# Altium integrated library TerminalBlocksRisingCage_5.00mm.IntLib: 64 symbols
Pins are listed as number, name and electrical type; pins without a type are passive.

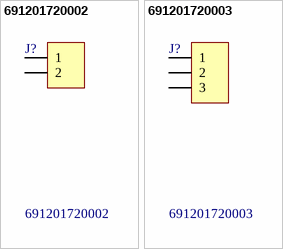
[diagram p0: symbols 691201720002 to 691201720003]

## 691201720002
designator J?
WR-TBL 45° Entry Modular with Rising Cage Clamp,Serie 201 - 5.00 mm; Manufacturer: Würth Elektronik eiSos GmbH; ComponentLink1 Description: Manufacturer; ComponentLink2 Description: Datasheet; NoPins: 2; Created Date: 21 Novenber 2013; partNo: 691201720002; ComponentLink1URL: http://www.we-online.com; ComponentLink2URL: http://katalog.we-online.de/em/datasheet/6912017200xx.pdf; Created by: Karrer Zheng
footprint 691201720002 (5,00mm - modular - blue -45° entry with rising cage clamp - 02p)
pins: 1, 2

## 691201720003
designator J?
WR-TBL 45° Entry Modular with Rising Cage Clamp,Serie 201 - 5.00 mm; Manufacturer: Würth Elektronik eiSos GmbH; ComponentLink1 Description: Manufacturer; ComponentLink2 Description: Datasheet; NoPins: 3; Created Date: 21 Novenber 2013; partNo: 691201720003; ComponentLink1URL: http://www.we-online.com; ComponentLink2URL: http://katalog.we-online.de/em/datasheet/6912017200xx.pdf; Created by: Karrer Zheng
footprint 691201720003 (5,00mm - modular - blue -45° entry with rising cage clamp - 03p)
pins: 1, 2, 3


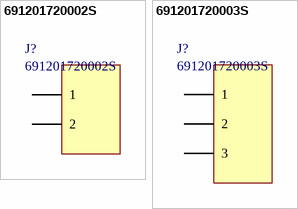
[diagram p1: symbols 691201720002S to 691201720003S]

## 691201720002S
designator J?
45° Cable Entry with Rising Cage Clamp, Serie 201S - 5.00 mm; Manufacturer: Wurth Elektronik; ComponentLink1 Description: Manufacturer; ComponentLink2 Description: Datasheet; NoPins: 2; ComponentLink1 URL: http://www.we-online.com; ComponentLink2 URL: http://katalog.we-online.de/em/datasheet/6912017200xxS.pdf; Created By: Baojun Chen; Created Date: 6-Aug-15; PartNo: 691201720002S
footprint 691201720002S (Serie 201S - 5.00 mm _ 2 pins)
pins: 1, 2

## 691201720003S
designator J?
45° Cable Entry with Rising Cage Clamp, Serie 201S - 5.00 mm; Manufacturer: Wurth Elektronik; ComponentLink1 Description: Manufacturer; ComponentLink2 Description: Datasheet; NoPins: 3; ComponentLink1 URL: http://www.we-online.com; ComponentLink2 URL: http://katalog.we-online.de/em/datasheet/6912017200xxS.pdf; Created By: Baojun Chen; Created Date: 6-Aug-15; PartNo: 691201720003S
footprint 691201720003S (Serie 201S - 5.00 mm _ 3 pins)
pins: 1, 2, 3


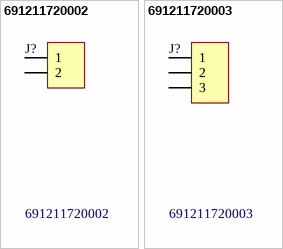
[diagram p2: symbols 691211720002 to 691211720003]

## 691211720002
designator J?
WR-TBL 45° Entry Modular with Rising Cage Clamp,Serie 211 - 5.00 mm - 15.5 mm Height; Manufacturer: Würth Elektronik eiSos GmbH; ComponentLink1 Description: Manufacturer; ComponentLink2 Description: Datasheet; NoPins: 2; Created Date: 25 Novenber 2013; partNo: 691211720002; ComponentLink1URL: http://www.we-online.com; ComponentLink2URL: http://katalog.we-online.de/em/datasheet/6912117200xx.pdf; Created by: Karrer Zheng
footprint 691211720002 (5,00mm - modular - green -45° entry with rising cage clamp - 02p)
pins: 1, 2

## 691211720003
designator J?
WR-TBL 45° Entry Modular with Rising Cage Clamp,Serie 211 - 5.00 mm - 15.5 mm Height; Manufacturer: Würth Elektronik eiSos GmbH; ComponentLink1 Description: Manufacturer; ComponentLink2 Description: Datasheet; NoPins: 3; Created Date: 25 Novenber 2013; partNo: 691211720003; ComponentLink1URL: http://www.we-online.com; ComponentLink2URL: http://katalog.we-online.de/em/datasheet/6912117200xx.pdf; Created by: Karrer Zheng
footprint 691211720003 (5,00mm - modular - green -45° entry with rising cage clamp - 03p)
pins: 1, 2, 3


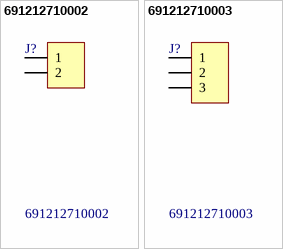
[diagram p3: symbols 691212710002 to 691212710003]

## 691212710002
designator J?
WR-TBL Horizontal Entry Modular with Rising Cage Clamp,Serie 212 - 5.00 mm; Manufacturer: Würth Elektronik eiSos GmbH; ComponentLink1 Description: Manufacturer; ComponentLink2 Description: Datasheet; NoPins: 2; Created Date: 25 Novenber 2013; partNo: 691212710002; ComponentLink1URL: http://www.we-online.com; ComponentLink2URL: http://katalog.we-online.de/em/datasheet/6912127200xx.pdf; Created by: Karrer Zheng
footprint 691212710002 (5,00mm - modular - green - Horizontal entry with rising cage clamp -  14,3mm height - 02p)
pins: 1, 2

## 691212710003
designator J?
WR-TBL Horizontal Entry Modular with Rising Cage Clamp,Serie 212 - 5.00 mm; Manufacturer: Würth Elektronik eiSos GmbH; ComponentLink1 Description: Manufacturer; ComponentLink2 Description: Datasheet; NoPins: 3; Created Date: 25 Novenber 2013; partNo: 691212710003; ComponentLink1URL: http://www.we-online.com; ComponentLink2URL: http://katalog.we-online.de/em/datasheet/6912127200xx.pdf; Created by: Karrer Zheng
footprint 691212710003 (5,00mm - modular - green - Horizontal entry with rising cage clamp -  14,3mm height - 03p)
pins: 1, 2, 3


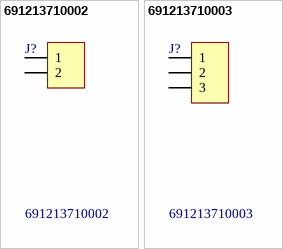
[diagram p4: symbols 691213710002 to 691213710003]

## 691213710002
designator J?
WR-TBL Horizontal Entry Modular with Rising Cage Clamp,Serie 213 - 5.00 mm; Manufacturer: Würth Elektronik eiSos GmbH; ComponentLink1 Description: Manufacturer; ComponentLink2 Description: Datasheet; NoPins: 2; Created Date: 25 Novenber 2013; partNo: 691213710002; ComponentLink1URL: http://www.we-online.com; ComponentLink2URL: http://katalog.we-online.de/em/datasheet/6912137100xx.pdf; Created by: Karrer Zheng
footprint 691213710002 (5,00mm - modular - green - Horizontal entry with rising cage clamp -  10,0mm height - 02p)
pins: 1, 2

## 691213710003
designator J?
WR-TBL Horizontal Entry Modular with Rising Cage Clamp,Serie 213 - 5.00 mm; Manufacturer: Würth Elektronik eiSos GmbH; ComponentLink1 Description: Manufacturer; ComponentLink2 Description: Datasheet; NoPins: 3; Created Date: 25 Novenber 2013; partNo: 691213710003; ComponentLink1URL: http://www.we-online.com; ComponentLink2URL: http://katalog.we-online.de/em/datasheet/6912137100xx.pdf; Created by: Karrer Zheng
footprint 691213710003 (5,00mm - modular - green - Horizontal entry with rising cage clamp -  10,0mm height - 03p)
pins: 1, 2, 3


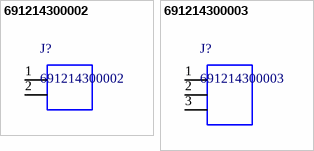
[diagram p5: symbols 691214300002 to 691214300003]

## 691214300002
designator J?
WR-TBL Vertical Cable Entry With Rising Cage Clamp,Serie 2143 - 3.81 mm; Manufacturer: Wurth Elektronik; ComponentLink1 Description: Manufacturer; ComponentLink2 Description: Datasheet; ComponentLink1URL: http://www.we-online.de; Created by: Baojun Chen; Created Date: 8.Sep.2015; partNo: 691214300002
footprint 691214300002 (Serie 2143 - 3.81 mm _ 2 pins)
pins: 1, 2

## 691214300003
designator J?
WR-TBL Vertical Cable Entry With Rising Cage Clamp,Serie 2143 - 3.81 mm; Manufacturer: Wurth Elektronik; ComponentLink1 Description: Manufacturer; ComponentLink2 Description: Datasheet; ComponentLink1URL: http://www.we-online.de; Created by: Baojun Chen; Created Date: 8.Sep.2015; partNo: 691214300003
footprint 691214300003 (Serie 2143 - 3.81 mm _ 3 pins)
pins: 1, 2, 3


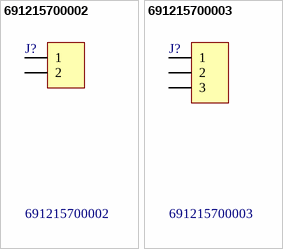
[diagram p6: symbols 691215700002 to 691215700003]

## 691215700002
designator J?
WR-TBL Vertical Entry Modular with Rising Cage Clamp,Serie 2157 - 5.00 mm; Manufacturer: Würth Elektronik eiSos GmbH; ComponentLink1 Description: Manufacturer; ComponentLink2 Description: Datasheet; NoPins: 2; Created Date: 26 Novenber 2013; partNo: 691215700002; ComponentLink1URL: http://www.we-online.com; ComponentLink2URL: http://katalog.we-online.de/em/datasheet/6912157000xx.pdf; Created by: Karrer Zheng
footprint 691215700002
pins: 1, 2

## 691215700003
designator J?
WR-TBL Vertical Entry Modular with Rising Cage Clamp,Serie 2157 - 5.00 mm; Manufacturer: Würth Elektronik eiSos GmbH; ComponentLink1 Description: Manufacturer; ComponentLink2 Description: Datasheet; NoPins: 3; Created Date: 26 Novenber 2013; partNo: 691215700003; ComponentLink1URL: http://www.we-online.com; ComponentLink2URL: http://katalog.we-online.de/em/datasheet/6912157000xx.pdf; Created by: Karrer Zheng
footprint 691215700003
pins: 1, 2, 3


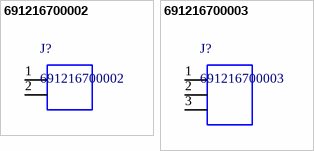
[diagram p7: symbols 691216700002 to 691216700003]

## 691216700002
designator J?
WR-TBL Vertical Cable Entry With Rising Cage Clamp,Serie 2167 - 5.00 mm; Manufacturer: Wurth Elektronik; ComponentLink1 Description: Manufacturer; ComponentLink2 Description: Datasheet; ComponentLink1URL: http://www.we-online.de; ComponentLink2URL: http://katalog.we-online.de/em/datasheet/6912167000XX.pdf; Created by: Baojun Chen; Created Date: 8.Sep.2015; partNo: 691216700002
footprint 691216700002 (Serie 2167 - 5.00 mm _ 2 pins)
pins: 1, 2

## 691216700003
designator J?
WR-TBL Vertical Cable Entry With Rising Cage Clamp,Serie 2167 - 5.00 mm; Manufacturer: Wurth Elektronik; ComponentLink1 Description: Manufacturer; ComponentLink2 Description: Datasheet; ComponentLink1URL: http://www.we-online.de; ComponentLink2URL: http://katalog.we-online.de/em/datasheet/6912167000XX.pdf; Created by: Baojun Chen; Created Date: 8.Sep.2015; partNo: 691216700003
footprint 691216700003 (Serie 2167 - 5.00 mm _ 3 pins)
pins: 1, 2, 3


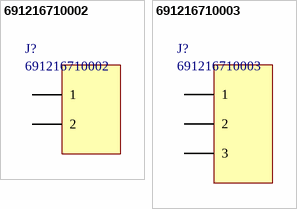
[diagram p8: symbols 691216710002 to 691216710003]

## 691216710002
designator J?
Horizontal Cable Entry with Rising Cage Clamp, Serie 2167 - 5.00 mm; Manufacturer: Wurth Elektronik; ComponentLink1 Description: Manufacturer; ComponentLink2 Description: Datasheet; NoPins: 2; ComponentLink1 URL: http://www.we-online.com; ComponentLink2 URL: http://katalog.we-online.de/em/datasheet/6912167100xx.pdf; Created By: Baojun Chen; Created Date: 6-Aug-15; PartNo: 691216710002
footprint 691216710002 (Serie 2167 - 5.00 mm _ 2 pins)
pins: 1, 2

## 691216710003
designator J?
Horizontal Cable Entry with Rising Cage Clamp, Serie 2167 - 5.00 mm; Manufacturer: Wurth Elektronik; ComponentLink1 Description: Manufacturer; ComponentLink2 Description: Datasheet; NoPins: 3; ComponentLink1 URL: http://www.we-online.com; ComponentLink2 URL: http://katalog.we-online.de/em/datasheet/6912167100xx.pdf; Created By: Baojun Chen; Created Date: 6-Aug-15; PartNo: 691216710003
footprint 691216710003 (Serie 2167 - 5.00 mm _ 3 pins)
pins: 1, 2, 3


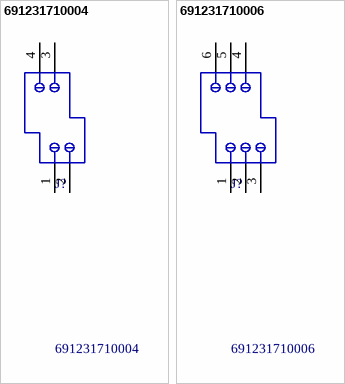
[diagram p9: symbols 691231710004 to 691231710006]

## 691231710004
designator J?
WR-TBL Double Level Horizontal Entry Modular with Rising Clamp,Serie 2317 - 5.00 mm; Manufacturer: Würth Elektronik eiSos GmbH; ComponentLink1 Description: Manufacturer; ComponentLink2 Description: Datasheet; NoPins: 4; Created Date: 26 Novenber 2013; partNo: 691231710004; ComponentLink1URL: http://www.we-online.com; ComponentLink2URL: http://katalog.we-online.de/em/datasheet/6912317100xx.pdf; Created by: Karrer Zheng
footprint 691231710004 (5,00mm - modular - 2 rows - Right - horizontal entry with rising cage clamp - 04p - h=19,1mm)
pins: 1, 2, 3, 4

## 691231710006
designator J?
WR-TBL Double Level Horizontal Entry Modular with Rising Clamp,Serie 2317 - 5.00 mm; Manufacturer: Würth Elektronik eiSos GmbH; ComponentLink1 Description: Manufacturer; ComponentLink2 Description: Datasheet; NoPins: 6; Created Date: 26 Novenber 2013; partNo: 691231710006; ComponentLink1URL: http://www.we-online.com; ComponentLink2URL: http://katalog.we-online.de/em/datasheet/6912317100xx.pdf; Created by: Karrer Zheng
footprint 691231710006 (5,00mm - modular - 2 rows - Right - horizontal entry with rising cage clamp - 06p - h=19,1mm)
pins: 1, 2, 3, 4, 5, 6


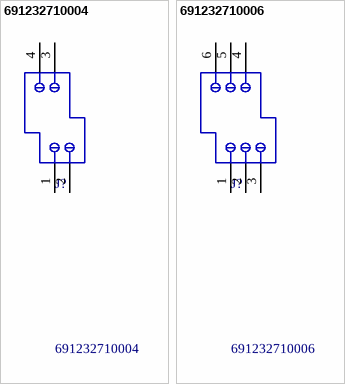
[diagram p10: symbols 691232710004 to 691232710006]

## 691232710004
designator J?
WR-TBL Double Level Horizontal Entry Modular with Rising Clamp,Serie 2327 - 5.00 mm; Manufacturer: Würth Elektronik eiSos GmbH; ComponentLink1 Description: Manufacturer; ComponentLink2 Description: Datasheet; NoPins: 4; Created Date: 26 Novenber 2013; partNo: 691232710004; ComponentLink1URL: http://www.we-online.com; ComponentLink2URL: http://katalog.we-online.de/em/datasheet/6912327100xx.pdf; Created by: Karrer Zheng
footprint 691232710004 (5,00mm - modular - 2 rows - Right - horizontal entry with rising cage clamp - 04p - h=25,3mm)
pins: 1, 2, 3, 4

## 691232710006
designator J?
WR-TBL Double Level Horizontal Entry Modular with Rising Clamp,Serie 2327 - 5.00 mm; Manufacturer: Würth Elektronik eiSos GmbH; ComponentLink1 Description: Manufacturer; ComponentLink2 Description: Datasheet; NoPins: 6; Created Date: 26 Novenber 2013; partNo: 691232710006; ComponentLink1URL: http://www.we-online.com; ComponentLink2URL: http://katalog.we-online.de/em/datasheet/6912327100xx.pdf; Created by: Karrer Zheng
footprint 691232710006 (5,00mm - modular - 2 rows - Right - horizontal entry with rising cage clamp - 06p - h=25,3mm)
pins: 1, 2, 3, 4, 5, 6


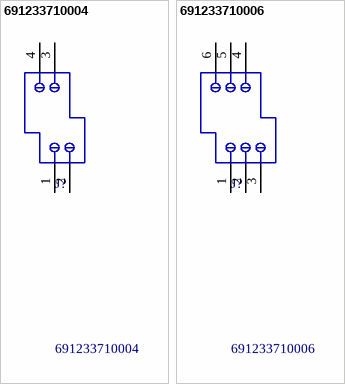
[diagram p11: symbols 691233710004 to 691233710006]

## 691233710004
designator J?
WR-TBL Double Level Horizontal Entry Modular with Rising Clamp,Serie 2337 - 5.00 mm; Manufacturer: Würth Elektronik eiSos GmbH; ComponentLink1 Description: Manufacturer; ComponentLink2 Description: Datasheet; NoPins: 4; Created Date: 27 Novenber 2013; partNo: 691233710004; ComponentLink1URL: http://www.we-online.com; ComponentLink2URL: http://katalog.we-online.de/em/datasheet/6912337100xx.pdf; Created by: Karrer Zheng
footprint 691233710004 (5,00mm - modular - 2 rows - Right - horizontal entry with rising cage clamp - 04p - h=31,5mm)
pins: 1, 2, 3, 4

## 691233710006
designator J?
WR-TBL Double Level Horizontal Entry Modular with Rising Clamp,Serie 2337 - 5.00 mm; Manufacturer: Würth Elektronik eiSos GmbH; ComponentLink1 Description: Manufacturer; ComponentLink2 Description: Datasheet; NoPins: 6; Created Date: 27 Novenber 2013; partNo: 691233710006; ComponentLink1URL: http://www.we-online.com; ComponentLink2URL: http://katalog.we-online.de/em/datasheet/6912337100xx.pdf; Created by: Karrer Zheng
footprint 691233710006 (5,00mm - modular - 2 rows - Right - horizontal entry with rising cage clamp - 06p - h=31,5mm)
pins: 1, 2, 3, 4, 5, 6


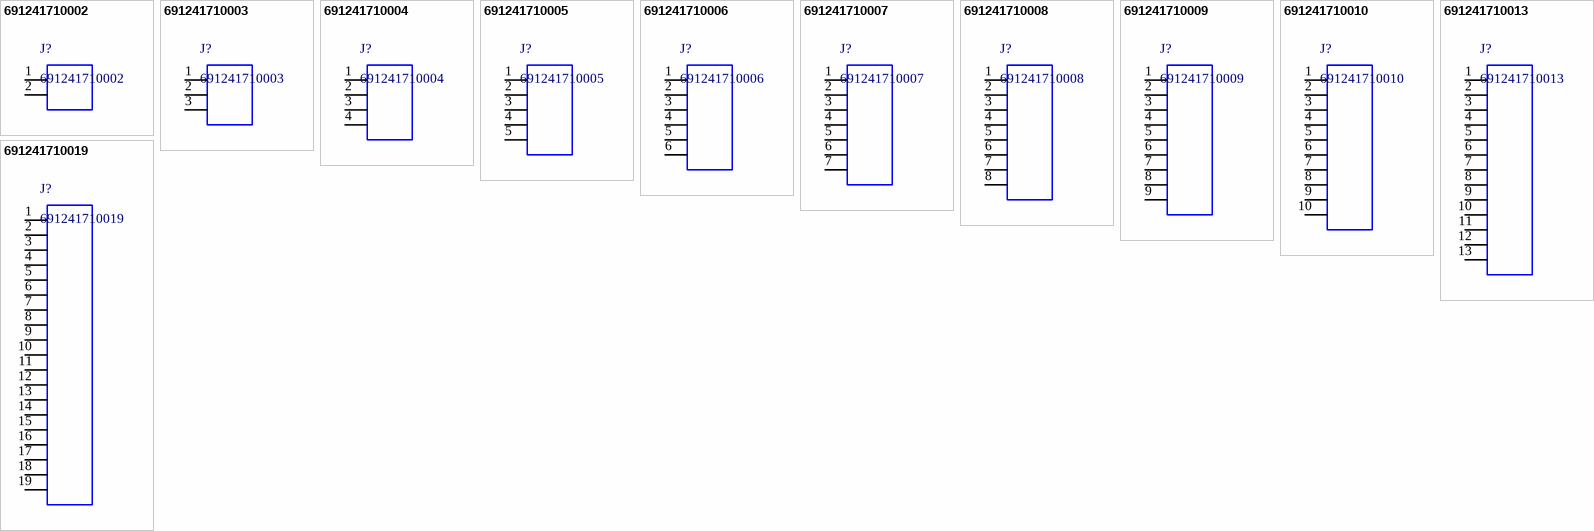
[diagram p12: symbols 691241710002 to 691241710019]

## 691241710002
designator J?
WR-TBL Horizontal Cable Entry With Rising Cage Clamp,Serie 2417 - 5.00 mm; Manufacturer: Wurth Elektronik; ComponentLink1 Description: Manufacturer; ComponentLink2 Description: Datasheet; ComponentLink1URL: http://www.we-online.de; ComponentLink2URL: http://katalog.we-online.de/em/datasheet/6912417100XX.pdf; Created by: Baojun Chen; Created Date: 8.Sep.2015; partNo: 691241710002
footprint 691241710002 (Serie 2417 - 5.00 mm _ 2 pins)
pins: 1, 2

## 691241710003
designator J?
WR-TBL Horizontal Cable Entry With Rising Cage Clamp,Serie 2417 - 5.00 mm; Manufacturer: Wurth Elektronik; ComponentLink1 Description: Manufacturer; ComponentLink2 Description: Datasheet; ComponentLink1URL: http://www.we-online.de; ComponentLink2URL: http://katalog.we-online.de/em/datasheet/6912417100XX.pdf; Created by: Baojun Chen; Created Date: 8.Sep.2015; partNo: 691241710003
footprint 691241710003 (Serie 2417 - 5.00 mm _ 3 pins)
pins: 1, 2, 3

## 691241710004
designator J?
WR-TBL Horizontal Cable Entry With Rising Cage Clamp,Serie 2417 - 5.00 mm; Manufacturer: Wurth Elektronik; ComponentLink1 Description: Manufacturer; ComponentLink2 Description: Datasheet; ComponentLink1URL: http://www.we-online.de; ComponentLink2URL: http://katalog.we-online.de/em/datasheet/6912417100XX.pdf; Created by: Baojun Chen; Created Date: 8.Sep.2015; partNo: 691241710004
footprint 691241710004 (Serie 2417 - 5.00 mm _ 4 pins)
pins: 1, 2, 3, 4

## 691241710005
designator J?
WR-TBL Horizontal Cable Entry With Rising Cage Clamp,Serie 2417 - 5.00 mm; Manufacturer: Wurth Elektronik; ComponentLink1 Description: Manufacturer; ComponentLink2 Description: Datasheet; ComponentLink1URL: http://www.we-online.de; ComponentLink2URL: http://katalog.we-online.de/em/datasheet/6912417100XX.pdf; Created by: Baojun Chen; Created Date: 8.Sep.2015; partNo: 691241710005
footprint 691241710005 (Serie 2417 - 5.00 mm _ 5 pins)
pins: 1, 2, 3, 4, 5

## 691241710006
designator J?
WR-TBL Horizontal Cable Entry With Rising Cage Clamp,Serie 2417 - 5.00 mm; Manufacturer: Wurth Elektronik; ComponentLink1 Description: Manufacturer; ComponentLink2 Description: Datasheet; ComponentLink1URL: http://www.we-online.de; ComponentLink2URL: http://katalog.we-online.de/em/datasheet/6912417100XX.pdf; Created by: Baojun Chen; Created Date: 8.Sep.2015; partNo: 691241710006
footprint 691241710006 (Serie 2417 - 5.00 mm _ 6 pins)
pins: 1, 2, 3, 4, 5, 6

## 691241710007
designator J?
WR-TBL Horizontal Cable Entry With Rising Cage Clamp,Serie 2417 - 5.00 mm; Manufacturer: Wurth Elektronik; ComponentLink1 Description: Manufacturer; ComponentLink2 Description: Datasheet; ComponentLink1URL: http://www.we-online.de; ComponentLink2URL: http://katalog.we-online.de/em/datasheet/6912417100XX.pdf; Created by: Baojun Chen; Created Date: 8.Sep.2015; partNo: 691241710007
footprint 691241710007 (Serie 2417 - 5.00 mm _ 7 pins)
pins: 1, 2, 3, 4, 5, 6, 7

## 691241710008
designator J?
WR-TBL Horizontal Cable Entry With Rising Cage Clamp,Serie 2417 - 5.00 mm; Manufacturer: Wurth Elektronik; ComponentLink1 Description: Manufacturer; ComponentLink2 Description: Datasheet; ComponentLink1URL: http://www.we-online.de; ComponentLink2URL: http://katalog.we-online.de/em/datasheet/6912417100XX.pdf; Created by: Baojun Chen; Created Date: 8.Sep.2015; partNo: 691241710008
footprint 691241710008 (Serie 2417 - 5.00 mm _ 8 pins)
pins: 1, 2, 3, 4, 5, 6, 7, 8

## 691241710009
designator J?
WR-TBL Horizontal Cable Entry With Rising Cage Clamp,Serie 2417 - 5.00 mm; Manufacturer: Wurth Elektronik; ComponentLink1 Description: Manufacturer; ComponentLink2 Description: Datasheet; ComponentLink1URL: http://www.we-online.de; ComponentLink2URL: http://katalog.we-online.de/em/datasheet/6912417100XX.pdf; Created by: Baojun Chen; Created Date: 8.Sep.2015; partNo: 691241710009
footprint 691241710009 (Serie 2417 - 5.00 mm _ 9 pins)
pins: 1, 2, 3, 4, 5, 6, 7, 8, 9

## 691241710010
designator J?
WR-TBL Horizontal Cable Entry With Rising Cage Clamp,Serie 2417 - 5.00 mm; Manufacturer: Wurth Elektronik; ComponentLink1 Description: Manufacturer; ComponentLink2 Description: Datasheet; ComponentLink1URL: http://www.we-online.de; ComponentLink2URL: http://katalog.we-online.de/em/datasheet/6912417100XX.pdf; Created by: Baojun Chen; Created Date: 8.Sep.2015; partNo: 691241710010
footprint 691241710010 (Serie 2417 - 5.00 mm _ 10 pins)
pins: 1, 2, 3, 4, 5, 6, 7, 8, 9, 10

## 691241710013
designator J?
WR-TBL Horizontal Cable Entry With Rising Cage Clamp,Serie 2417 - 5.00 mm; Manufacturer: Wurth Elektronik; ComponentLink1 Description: Manufacturer; ComponentLink2 Description: Datasheet; ComponentLink1URL: http://www.we-online.de; ComponentLink2URL: http://katalog.we-online.de/em/datasheet/6912417100XX.pdf; Created by: Baojun Chen; Created Date: 8.Sep.2015; partNo: 691241710013
footprint 691241710013 (Serie 2417 - 5.00 mm _ 13 pins)
pins: 1, 2, 3, 4, 5, 6, 7, 8, 9, 10, 11, 12, 13

## 691241710019
designator J?
WR-TBL Horizontal Cable Entry With Rising Cage Clamp,Serie 2417 - 5.00 mm; Manufacturer: Wurth Elektronik; ComponentLink1 Description: Manufacturer; ComponentLink2 Description: Datasheet; ComponentLink1URL: http://www.we-online.de; ComponentLink2URL: http://katalog.we-online.de/em/datasheet/6912417100XX.pdf; Created by: Baojun Chen; Created Date: 8.Sep.2015; partNo: 691241710019
footprint 691241710019 (Serie 2417 - 5.00 mm _ 19 pins)
pins: 1, 2, 3, 4, 5, 6, 7, 8, 9, 10, 11, 12, 13, 14, 15, 16, 17, 18, 19


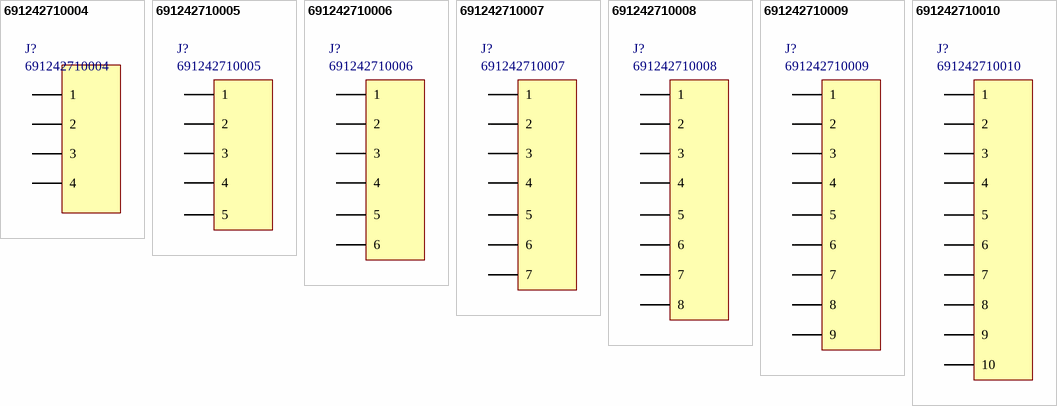
[diagram p13: symbols 691242710004 to 691242710010]

## 691242710004
designator J?
Horizontal Cable Entry with Rising Cage Clamp, Serie 2427 - 5.00 mm; Manufacturer: Wurth Elektronik; ComponentLink1 Description: Manufacturer; ComponentLink2 Description: Datasheet; NoPins: 4; ComponentLink1 URL: http://www.we-online.com; ComponentLink2 URL: http://katalog.we-online.de/em/datasheet/6912427100xx.pdf; Created By: Baojun Chen; Created Date: 26.Aug.2015; PartNo: 691242710004
footprint 691242710004 (Serie 2427 - 5.00 mm_4 pins)
pins: 1, 2, 3, 4

## 691242710005
designator J?
Horizontal Cable Entry with Rising Cage Clamp, Serie 2427 - 5.00 mm; Manufacturer: Wurth Elektronik; ComponentLink1 Description: Manufacturer; ComponentLink2 Description: Datasheet; NoPins: 5; ComponentLink1 URL: http://www.we-online.com; ComponentLink2 URL: http://katalog.we-online.de/em/datasheet/6912427100xx.pdf; Created By: Baojun Chen; Created Date: 26.Aug.2015; PartNo: 691242710005
footprint 691242710005 (Serie 2427 - 5.00 mm_5 pins)
pins: 1, 2, 3, 4, 5

## 691242710006
designator J?
Horizontal Cable Entry with Rising Cage Clamp, Serie 2427 - 5.00 mm; Manufacturer: Wurth Elektronik; ComponentLink1 Description: Manufacturer; ComponentLink2 Description: Datasheet; NoPins: 6; ComponentLink1 URL: http://www.we-online.com; ComponentLink2 URL: http://katalog.we-online.de/em/datasheet/6912427100xx.pdf; Created By: Baojun Chen; Created Date: 26.Aug.2015; PartNo: 691242710006
footprint 691242710006 (Serie 2427 - 5.00 mm_6 pins)
pins: 1, 2, 3, 4, 5, 6

## 691242710007
designator J?
Horizontal Cable Entry with Rising Cage Clamp, Serie 2427 - 5.00 mm; Manufacturer: Wurth Elektronik; ComponentLink1 Description: Manufacturer; ComponentLink2 Description: Datasheet; NoPins: 7; ComponentLink1 URL: http://www.we-online.com; ComponentLink2 URL: http://katalog.we-online.de/em/datasheet/6912427100xx.pdf; Created By: Baojun Chen; Created Date: 26.Aug.2015; PartNo: 691242710007
footprint 691242710007 (Serie 2427 - 5.00 mm_7 pins)
pins: 1, 2, 3, 4, 5, 6, 7

## 691242710008
designator J?
Horizontal Cable Entry with Rising Cage Clamp, Serie 2427 - 5.00 mm; Manufacturer: Wurth Elektronik; ComponentLink1 Description: Manufacturer; ComponentLink2 Description: Datasheet; NoPins: 8; ComponentLink1 URL: http://www.we-online.com; ComponentLink2 URL: http://katalog.we-online.de/em/datasheet/6912427100xx.pdf; Created By: Baojun Chen; Created Date: 26.Aug.2015; PartNo: 691242710008
footprint 691242710008 (Serie 2427 - 5.00 mm_8 pins)
pins: 1, 2, 3, 4, 5, 6, 7, 8

## 691242710009
designator J?
Horizontal Cable Entry with Rising Cage Clamp, Serie 2427 - 5.00 mm; Manufacturer: Wurth Elektronik; ComponentLink1 Description: Manufacturer; ComponentLink2 Description: Datasheet; NoPins: 9; ComponentLink1 URL: http://www.we-online.com; ComponentLink2 URL: http://katalog.we-online.de/em/datasheet/6912427100xx.pdf; Created By: Baojun Chen; Created Date: 26.Aug.2015; PartNo: 691242710009
footprint 691242710009 (Serie 2427 - 5.00 mm_9 pins)
pins: 1, 2, 3, 4, 5, 6, 7, 8, 9

## 691242710010
designator J?
Horizontal Cable Entry with Rising Cage Clamp, Serie 2427 - 5.00 mm; Manufacturer: Wurth Elektronik; ComponentLink1 Description: Manufacturer; ComponentLink2 Description: Datasheet; NoPins: 10; ComponentLink1 URL: http://www.we-online.com; ComponentLink2 URL: http://katalog.we-online.de/em/datasheet/6912427100xx.pdf; Created By: Baojun Chen; Created Date: 26.Aug.2015; PartNo: 691242710010
footprint 691242710010 (Serie 2427 - 5.00 mm_10 pins)
pins: 1, 2, 3, 4, 5, 6, 7, 8, 9, 10


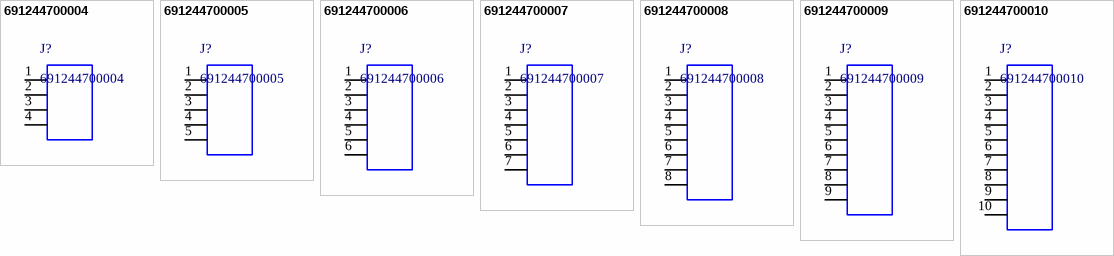
[diagram p14: symbols 691244700004 to 691244700010]

## 691244700004
designator J?
WR-TBL Vertical Cable Entry With Rising Cage Clamp,Serie 2447 - 5.00 mm; Manufacturer: Wurth Elektronik; ComponentLink1 Description: Manufacturer; ComponentLink2 Description: Datasheet; ComponentLink1URL: http://www.we-online.de; ComponentLink2URL: http://katalog.we-online.de/em/datasheet/6912447000XX.pdf; Created by: Baojun Chen; Created Date: 15.Sep.2015; partNo: 691244700004
footprint 691244700004 (Serie 2447 - 5.00 mm _ 4 pins)
pins: 1, 2, 3, 4

## 691244700005
designator J?
WR-TBL Vertical Cable Entry With Rising Cage Clamp,Serie 2447 - 5.00 mm; Manufacturer: Wurth Elektronik; ComponentLink1 Description: Manufacturer; ComponentLink2 Description: Datasheet; ComponentLink1URL: http://www.we-online.de; ComponentLink2URL: http://katalog.we-online.de/em/datasheet/6912447000XX.pdf; Created by: Baojun Chen; Created Date: 15.Sep.2015; partNo: 691244700005
footprint 691244700005 (Serie 2447 - 5.00 mm _ 5 pins)
pins: 1, 2, 3, 4, 5

## 691244700006
designator J?
WR-TBL Vertical Cable Entry With Rising Cage Clamp,Serie 2447 - 5.00 mm; Manufacturer: Wurth Elektronik; ComponentLink1 Description: Manufacturer; ComponentLink2 Description: Datasheet; ComponentLink1URL: http://www.we-online.de; ComponentLink2URL: http://katalog.we-online.de/em/datasheet/6912447000XX.pdf; Created by: Baojun Chen; Created Date: 15.Sep.2015; partNo: 691244700006
footprint 691244700006 (Serie 2447 - 5.00 mm _ 6 pins)
pins: 1, 2, 3, 4, 5, 6

## 691244700007
designator J?
WR-TBL Vertical Cable Entry With Rising Cage Clamp,Serie 2447 - 5.00 mm; Manufacturer: Wurth Elektronik; ComponentLink1 Description: Manufacturer; ComponentLink2 Description: Datasheet; ComponentLink1URL: http://www.we-online.de; ComponentLink2URL: http://katalog.we-online.de/em/datasheet/6912447000XX.pdf; Created by: Baojun Chen; Created Date: 15.Sep.2015; partNo: 691244700007
footprint 691244700007 (Serie 2447 - 5.00 mm _ 7 pins)
pins: 1, 2, 3, 4, 5, 6, 7

## 691244700008
designator J?
WR-TBL Vertical Cable Entry With Rising Cage Clamp,Serie 2447 - 5.00 mm; Manufacturer: Wurth Elektronik; ComponentLink1 Description: Manufacturer; ComponentLink2 Description: Datasheet; ComponentLink1URL: http://www.we-online.de; ComponentLink2URL: http://katalog.we-online.de/em/datasheet/6912447000XX.pdf; Created by: Baojun Chen; Created Date: 15.Sep.2015; partNo: 691244700008
footprint 691244700008 (Serie 2447 - 5.00 mm _ 8 pins)
pins: 1, 2, 3, 4, 5, 6, 7, 8

## 691244700009
designator J?
WR-TBL Vertical Cable Entry With Rising Cage Clamp,Serie 2447 - 5.00 mm; Manufacturer: Wurth Elektronik; ComponentLink1 Description: Manufacturer; ComponentLink2 Description: Datasheet; ComponentLink1URL: http://www.we-online.de; ComponentLink2URL: http://katalog.we-online.de/em/datasheet/6912447000XX.pdf; Created by: Baojun Chen; Created Date: 15.Sep.2015; partNo: 691244700009
footprint 691244700009 (Serie 2447 - 5.00 mm _ 9 pins)
pins: 1, 2, 3, 4, 5, 6, 7, 8, 9

## 691244700010
designator J?
WR-TBL Vertical Cable Entry With Rising Cage Clamp,Serie 2447 - 5.00 mm; Manufacturer: Wurth Elektronik; ComponentLink1 Description: Manufacturer; ComponentLink2 Description: Datasheet; ComponentLink1URL: http://www.we-online.de; ComponentLink2URL: http://katalog.we-online.de/em/datasheet/6912447000XX.pdf; Created by: Baojun Chen; Created Date: 15.Sep.2015; partNo: 691244700010
footprint 691244700010 (Serie 2447 - 5.00 mm _ 10 pins)
pins: 1, 2, 3, 4, 5, 6, 7, 8, 9, 10


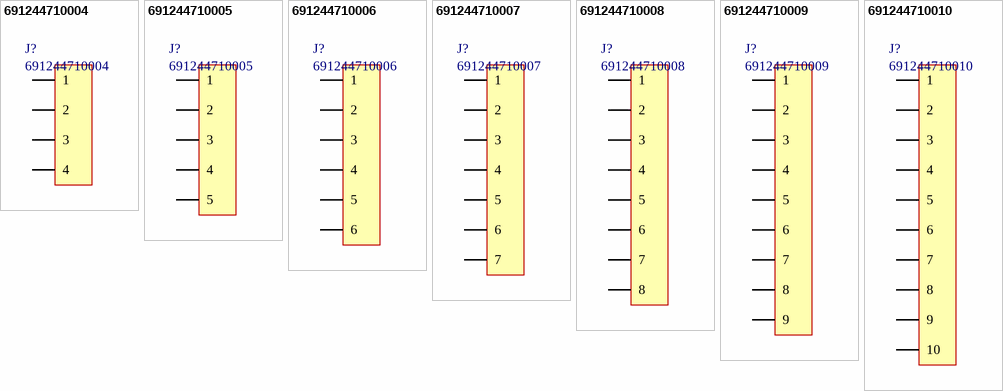
[diagram p15: symbols 691244710004 to 691244710010]

## 691244710004
designator J?
Horizontal Cable Entry with Rising Cage Clamp, Serie 2447 - 5mm; Manufacturer: Wurth Elektronik; ComponentLink1 Description: Manufacturer; ComponentLink2 Description: Datasheet; NoPins: 4; ComponentLink1 URL: http://www.we-online.com; ComponentLink2 URL: http://katalog.we-online.de/em/datasheet/6912447100xx.pdf; Created By: Baojun Chen; Created Date: 27.Aug.2015; PartNo: 691244710004
footprint 691244710004 (Serie 2447 - 5.00 mm _ 4 pins)
pins: 1, 2, 3, 4

## 691244710005
designator J?
Horizontal Cable Entry with Rising Cage Clamp, Serie 2447 - 5mm; Manufacturer: Wurth Elektronik; ComponentLink1 Description: Manufacturer; ComponentLink2 Description: Datasheet; NoPins: 5; ComponentLink1 URL: http://www.we-online.com; ComponentLink2 URL: http://katalog.we-online.de/em/datasheet/6912447100xx.pdf; Created By: Baojun Chen; Created Date: 27.Aug.2015; PartNo: 691244710005
footprint 691244710005 (Serie 2447 - 5.00 mm _ 5 pins)
pins: 1, 2, 3, 4, 5

## 691244710006
designator J?
Horizontal Cable Entry with Rising Cage Clamp, Serie 2447 - 5mm; Manufacturer: Wurth Elektronik; ComponentLink1 Description: Manufacturer; ComponentLink2 Description: Datasheet; NoPins: 6; ComponentLink1 URL: http://www.we-online.com; ComponentLink2 URL: http://katalog.we-online.de/em/datasheet/6912447100xx.pdf; Created By: Baojun Chen; Created Date: 27.Aug.2015; PartNo: 691244710006
footprint 691244710006 (Serie 2447 - 5.00 mm _ 6 pins)
pins: 1, 2, 3, 4, 5, 6

## 691244710007
designator J?
Horizontal Cable Entry with Rising Cage Clamp, Serie 2447 - 5mm; Manufacturer: Wurth Elektronik; ComponentLink1 Description: Manufacturer; ComponentLink2 Description: Datasheet; NoPins: 7; ComponentLink1 URL: http://www.we-online.com; ComponentLink2 URL: http://katalog.we-online.de/em/datasheet/6912447100xx.pdf; Created By: Baojun Chen; Created Date: 27.Aug.2015; PartNo: 691244710007
footprint 691244710007 (Serie 2447 - 5.00 mm _ 7 pins)
pins: 1, 2, 3, 4, 5, 6, 7

## 691244710008
designator J?
Horizontal Cable Entry with Rising Cage Clamp, Serie 2447 - 5mm; Manufacturer: Wurth Elektronik; ComponentLink1 Description: Manufacturer; ComponentLink2 Description: Datasheet; NoPins: 8; ComponentLink1 URL: http://www.we-online.com; ComponentLink2 URL: http://katalog.we-online.de/em/datasheet/6912447100xx.pdf; Created By: Baojun Chen; Created Date: 27.Aug.2015; PartNo: 691244710008
footprint 691244710008 (Serie 2447 - 5.00 mm _ 8 pins)
pins: 1, 2, 3, 4, 5, 6, 7, 8

## 691244710009
designator J?
Horizontal Cable Entry with Rising Cage Clamp, Serie 2447 - 5mm; Manufacturer: Wurth Elektronik; ComponentLink1 Description: Manufacturer; ComponentLink2 Description: Datasheet; NoPins: 9; ComponentLink1 URL: http://www.we-online.com; ComponentLink2 URL: http://katalog.we-online.de/em/datasheet/6912447100xx.pdf; Created By: Baojun Chen; Created Date: 27.Aug.2015; PartNo: 691244710009
footprint 691244710009 (Serie 2447 - 5.00 mm _ 9 pins)
pins: 1, 2, 3, 4, 5, 6, 7, 8, 9

## 691244710010
designator J?
Horizontal Cable Entry with Rising Cage Clamp, Serie 2447 - 5mm; Manufacturer: Wurth Elektronik; ComponentLink1 Description: Manufacturer; ComponentLink2 Description: Datasheet; NoPins: 10; ComponentLink1 URL: http://www.we-online.com; ComponentLink2 URL: http://katalog.we-online.de/em/datasheet/6912447100xx.pdf; Created By: Baojun Chen; Created Date: 27.Aug.2015; PartNo: 691244710010
footprint 691244710010 (Serie 2447 - 5.00 mm _ 10 pins)
pins: 1, 2, 3, 4, 5, 6, 7, 8, 9, 10


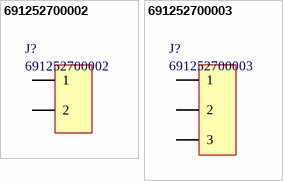
[diagram p16: symbols 691252700002 to 691252700003]

## 691252700002
designator J?
Horizontal Cable Entry with Rising Cage Clamp, Serie 2527 - 5mm; Manufacturer: Wurth Elektronik; ComponentLink1 Description: Manufacturer; ComponentLink2 Description: Datasheet; NoPins: 2; ComponentLink1 URL: http://www.we-online.com; ComponentLink2 URL: http://katalog.we-online.de/em/datasheet/6912527000xx.pdf; Created By: Baojun Chen; Created Date: 27.Aug.2015; PartNo: 691252700002
footprint 691252700002 (Serie 2527 - 5.00 mm _ 2 pins)
pins: 1, 2

## 691252700003
designator J?
Horizontal Cable Entry with Rising Cage Clamp, Serie 2527 - 5mm; Manufacturer: Wurth Elektronik; ComponentLink1 Description: Manufacturer; ComponentLink2 Description: Datasheet; NoPins: 3; ComponentLink1 URL: http://www.we-online.com; ComponentLink2 URL: http://katalog.we-online.de/em/datasheet/6912527000xx.pdf; Created By: Baojun Chen; Created Date: 27.Aug.2015; PartNo: 691252700003
footprint 691252700003 (Serie 2527 - 5.00 mm _ 3 pins)
pins: 1, 2, 3


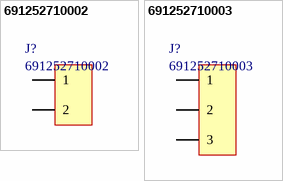
[diagram p17: symbols 691252710002 to 691252710003]

## 691252710002
designator J?
Horizontal Cable Entry with Rising Cage Clamp, Serie 2527 - 5mm; Manufacturer: Wurth Elektronik; ComponentLink1 Description: Manufacturer; ComponentLink2 Description: Datasheet; NoPins: 2; ComponentLink1 URL: http://www.we-online.com; ComponentLink2 URL: http://katalog.we-online.de/em/datasheet/6912527100xx.pdf; Created By: Baojun Chen; Created Date: 27.Aug.2015; PartNo: 691252710002
footprint 691252710002 (Serie 2527 - 5.00 mm _ 2 pins)
pins: 1, 2

## 691252710003
designator J?
Horizontal Cable Entry with Rising Cage Clamp, Serie 2527 - 5mm; Manufacturer: Wurth Elektronik; ComponentLink1 Description: Manufacturer; ComponentLink2 Description: Datasheet; NoPins: 3; ComponentLink1 URL: http://www.we-online.com; ComponentLink2 URL: http://katalog.we-online.de/em/datasheet/6912527100xx.pdf; Created By: Baojun Chen; Created Date: 27.Aug.2015; PartNo: 691252710003
footprint 691252710003 (Serie 2527 - 5.00 mm _ 3 pins)
pins: 1, 2, 3


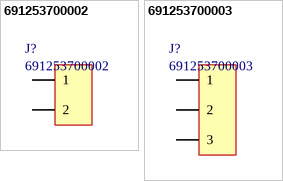
[diagram p18: symbols 691253700002 to 691253700003]

## 691253700002
designator J?
Horizontal Cable Entry with Rising Cage Clamp, Serie 2537 - 5mm; Manufacturer: Wurth Elektronik; ComponentLink1 Description: Manufacturer; ComponentLink2 Description: Datasheet; NoPins: 2; ComponentLink1 URL: http://www.we-online.com; ComponentLink2 URL: http://katalog.we-online.de/em/datasheet/6912537000xx.pdf; Created By: Baojun Chen; Created Date: 28.Aug.2015; PartNo: 691253700002
footprint 691253700002 (Serie 2537 - 5.00 mm _ 2 pins)
pins: 1, 2

## 691253700003
designator J?
Horizontal Cable Entry with Rising Cage Clamp, Serie 2537 - 5mm; Manufacturer: Wurth Elektronik; ComponentLink1 Description: Manufacturer; ComponentLink2 Description: Datasheet; NoPins: 3; ComponentLink1 URL: http://www.we-online.com; ComponentLink2 URL: http://katalog.we-online.de/em/datasheet/6912537000xx.pdf; Created By: Baojun Chen; Created Date: 28.Aug.2015; PartNo: 691253700003
footprint 691253700003 (Serie 2537 - 5.00 mm _ 3 pins)
pins: 1, 2, 3


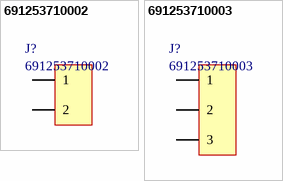
[diagram p19: symbols 691253710002 to 691253710003]

## 691253710002
designator J?
Horizontal Cable Entry with Rising Cage Clamp, Serie 2537 - 5mm; Manufacturer: Wurth Elektronik; ComponentLink1 Description: Manufacturer; ComponentLink2 Description: Datasheet; NoPins: 2; ComponentLink1 URL: http://www.we-online.com; ComponentLink2 URL: http://katalog.we-online.de/en/em/691_253_710_0xx; Created By: Baojun Chen; Created Date: 28.Aug.2015; PartNo: 691253710002
footprint 691253710002 (Serie 2537 - 5.00 mm _ 2 pins)
pins: 1, 2

## 691253710003
designator J?
Horizontal Cable Entry with Rising Cage Clamp, Serie 2537 - 5mm; Manufacturer: Wurth Elektronik; ComponentLink1 Description: Manufacturer; ComponentLink2 Description: Datasheet; NoPins: 3; ComponentLink1 URL: http://www.we-online.com; ComponentLink2 URL: http://katalog.we-online.de/en/em/691_253_710_0xx; Created By: Baojun Chen; Created Date: 28.Aug.2015; PartNo: 691253710003
footprint 691253710003 (Serie 2537 - 5.00 mm _ 3 pins)
pins: 1, 2, 3